# Altium footprint library mmyLibrary.PcbLib: 231 footprints (part 15 of 15)
Each footprint in its own frame and in the unit in brackets; x right, y up, seen from the top. Pads: shape width x height; smd on the part's side, far side on the other; paste and mask are expansions set on the pad; w line width, h text height; cw(c..) or ccw(c..) is an arc to the next point about the centre after c.
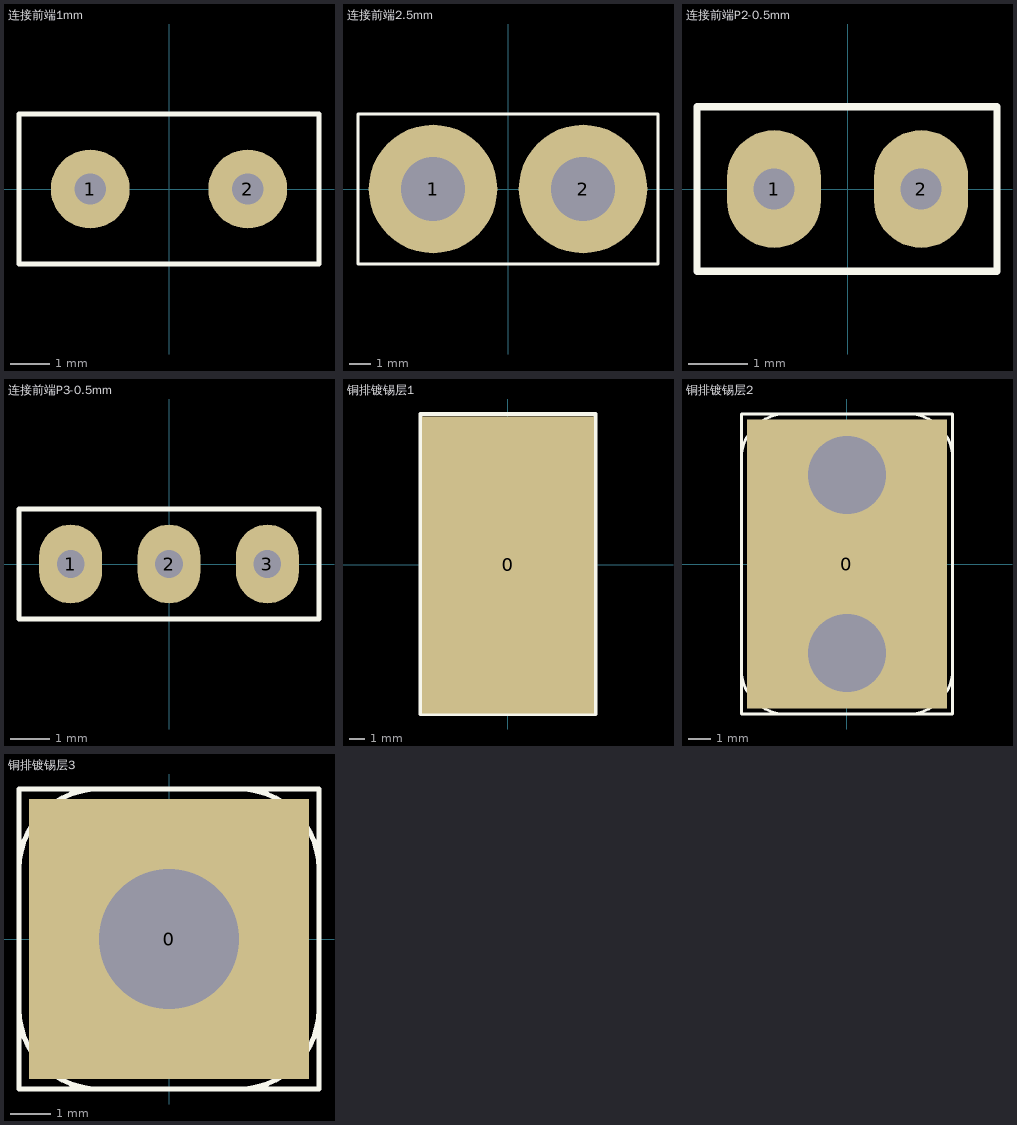
[diagram p14: the footprints below, top view; thin cyan lines are the x and y axes]

## 连接前端1mm [mm]
pads (2):
  round 2 hole 0.8: 1(-2,0) 2(2,0)
Top Overlay:
  lines w0.127: -3.81,-1.905 3.81,-1.905 3.81,1.905 -3.81,1.905 -3.81,0 -3.81,-1.905

## 连接前端2.5mm [mm] "孔径：2.5mm"
pads (2):
  round 6 hole 3: 1(-3.5,0) 2(3.5,0)
Top Overlay:
  lines w0.127: -7,-3.5 7,-3.5 7,3.5 -7,3.5 -7,-3.5

## 连接前端P2-0.5mm [mm]
pads (2):
  oval 1.6x2 hole 0.7: 1(-1.25,0) 2(1.25,0)
Top Overlay:
  lines w0.127: -2.56,-1.397 -2.56,1.397 2.54,1.397 2.54,-1.397 -2.56,-1.397

## 连接前端P3-0.5mm [mm]
pads (3):
  oval 1.6x2 hole 0.7: 1(-2.5,0) 2(0,0) 3(2.5,0)
Top Overlay:
  lines w0.127: -3.81,-1.397 3.81,-1.397 3.81,1.397 -3.81,1.397 -3.81,-1.397

## 铜排镀锡层1 [mm]
pads (1):
  rect 11x19 smd: 0(0,0)
Top Overlay:
  lines w0.254: -5.588,-9.525 -5.588,9.652 5.588,9.652 5.588,-9.525 -0.254,-9.525 -5.588,-9.525

## 铜排镀锡层2 [mm]
pads (3):
  rect 9x13 smd: 0(0,0)
  round 0 hole 3.5: 1(0,-4) 1(0,4)
Top Overlay:
  lines w0.127: -4.75,-4.75 ccw(c-2.75,-4.75) -2.75,-6.75 ; -4.75,4.75 cw(c-2.75,4.75) -2.75,6.75 ; 2.75,-6.75 ccw(c2.75,-4.75) 4.75,-4.75 ; 2.75,6.75 cw(c2.75,4.75) 4.75,4.75 ; -4.75,-6.75 4.75,-6.75 4.75,6.75 -4.75,6.75 -4.75,-6.75

## 铜排镀锡层3 [mm]
pads (2):
  rect 7x7 smd: 0(0,0)
  round 0 hole 3.5: 1(0,0)
Top Overlay:
  lines w0.127: -3.75,-1.75 ccw(c-1.75,-1.75) -1.75,-3.75 ; -3.75,1.75 cw(c-1.75,1.75) -1.75,3.75 ; 1.75,-3.75 ccw(c1.75,-1.75) 3.75,-1.75 ; 1.75,3.75 cw(c1.75,1.75) 3.75,1.75 ; -3.75,-3.75 3.75,-3.75 3.75,3.75 -3.75,3.75 -3.75,-3.75